# Altium schematic symbol library Altium_Lib.SchLib: 403 symbols (part 2 of 4) (continued)
## DIODE_TV02W6V0B-G (continued)

## DIODE_US1M-13-F
designator D?, comment US1M-13-F
DIODE GEN PURP 1KV 1A SMA; Manufacturer: Diodes Incorporated; Diode Type: Standard; Speed: Fast Recovery =< 500ns, > 200mA (Io); Capacitance @ Vr, F: 10pF @ 4V, 1MHz; Current - Reverse Leakage @ Vr: 5µA @ 1000V; Part Status: Active; Current - Average Rectified (Io): 1A; Packaging: Tape & Reel (TR); RoHS: RoHS Compliant; Base Part Number: US1M; Operating Temperature - Junction: -65°C ~ 150°C; Supplier Device Package: SMA; Package / Case: DO-214AC, SMA; Mounting Type: Surface Mount; Supplier: Digi-Key; Category: Discrete Semiconductor Products; Manufacturer Part Number: US1M-13-F; ComponentLink1URL: https://www.diodes.com/assets/Datasheets/ds16008.pdf; ComponentLink1Description: https://www.diodes.com/assets/Datasheets/ds16008.pdf; Pricing: 5000=0.0935, 10000=0.08525, 25000=0.07975, 50000=0.0715 (USD); Supplier Part Number: US1M-FDITR-ND
footprint DO-214AC-SMA
pins: 1 A, 2 K

## DRV5053VAQDBZR
designator U?
SENSOR LINEAR ANALOG SOT23-3; Manufacturer: Texas Instruments; Axis: Single; Current - Output (Max): 2.3mA; Sensing Range: ±9mT; Current - Supply (Max): 3.6mA; Bandwidth: 20kHz; Voltage - Supply: 2.5 V ~ 38 V; Output Type: Analog Voltage; RoHS: RoHS Compliant; Features: Temperature Compensated; Supplier Device Package: SOT-23-3; Resolution: -; Packaging: Tape & Reel (TR); Part Status: Active; Operating Temperature: -40°C ~ 125°C (TA); Package / Case: TO-236-3, SC-59, SOT-23-3; Technology: Hall Effect; Manufacturer Part Number: DRV5053VAQDBZR; Category: Sensors, Transducers; Supplier: Digi-Key; ComponentLink1URL: http://www.ti.com/lit/ds/symlink/drv5053.pdf; ComponentLink1Description: http://www.ti.com/lit/ds/symlink/drv5053.pdf; Pricing: 3000=0.4368, 6000=0.4095, 9000=0.38903, 15000=0.37538 (USD); Supplier Part Number: 296-38460-2-ND
footprint SOT23_L (SOT23, 3-Leads, Body 2.9x1.3mm, Pitch 0.95mm, Lead Span 2.3mm, IPC High Density)
pins: 1 VCC, 2 OUT, 3 GND

## DRV8825_DEV_BOARD
designator U?
DRV8825 STEPPER MTR DRVR CARRIER; Manufacturer: Pololu Corporation; Manufacturer Part Number: 2977
footprint DRV8825_DEV_BOARD
pins: 1 ENABLE, 2 M0, 3 M1, 4 M2, 5 RESET, 6 SLEEP, 7 STEP, 8 DIR, 9 GND, 10 FAULT, 11 A2, 12 A1, 13 B1, 14 B2, 15 GND, 16 VMOT

## DRV8825PWPR
designator U?
IC MTR DRVR BIPLR 8.2-45V 28SSOP; Manufacturer: Texas Instruments; Number of Outputs: 2 Output; Output Current: 1.8 A; Development Kit: DRV8825EVM; Operating Supply Current: 5 mA; Operating Supply Voltage: 8.2 V to 45 V; Rds On - Drain-Source Resistance: 400 mOhms; Supplier 1: Mouser; Manufacturer Part Number: DRV8825PWPR; RoHS: RoHS Compliant; Category: Motor / Motion / Ignition Controllers & Drivers; Stock 1: 8639; Pricing 1: 1=4.25, 10=3.81, 25=3.60, 100=2.96, 250=2.66, 500=2.56, 1000=2.13, 2000=2.05, 4000=1.99 (USD); Features: Integrated micro-stepping; Operating Temperature Range: - 40 C to + 85 C; Package / Case: HTSSOP-28; Packaging: Cut Tape; Product: Stepper Motor Controllers / Drivers; Series: DRV8825; Type: Stepping Motor Controller; Brand: Texas Instruments; Mounting Style: SMD/SMT; Maximum Operating Temperature: + 85 C; Minimum Operating Temperature: - 40 C; Moisture Sensitive: Yes; Product Type: Motor / Motion / Ignition Controllers & Drivers; Standard Pack Qty: 2000; Subcategory: PMIC - Power Management ICs; RoHS - Mouser: Y; Minimum Order Quantity: 1; Reeling: True; Supplier Part Number 1: 595-DRV8825PWPR
footprint TSSOP-28-PowerPad
pins: 0 GND, 1 CP1, 2 CP2, 3 VCP, 4 VMA, 5 AOUT1, 6 ISENA, 7 AOUT2, 8 BOUT2, 9 ISENB, 10 BOUT1, 11 VMB, 12 AVREF, 13 BVREF, 14 GND, 15 V3P3OUT, 16 nRESET, 17 nSLEEP, 18 nFAULT, 19 DECAY, 20 DIR, 21 nENBL, 22 STEP, 23 NC, 24 MODE0, 25 MODE1, 26 MODE2, 27 nHOME, 28 GND

## DRV8844PWPR
designator U?
IC MTR DRV BIPOLR 8-60V 28HTSSOP; Manufacturer: Texas Instruments; Number of Outputs: 4 Output; Output Current: 3.5 A; Development Kit: DRV8844EVM; Operating Supply Current: 1 mA; Operating Supply Voltage: 8 V to 60 V; Rds On - Drain-Source Resistance: 480 mOhms; Supplier 1: Mouser; RoHS: RoHS Compliant; Category: Motor / Motion / Ignition Controllers & Drivers; Stock 1: 8824; Pricing 1: 1=3.32, 10=2.98, 25=2.82, 100=2.32, 250=2.08, 500=2.00, 1000=1.67, 2000=1.60, 4000=1.55 (USD); Features: Independent 1/2-H PWM Control, Split-Rail Support; Operating Temperature Range: - 40 C to + 85 C; Package / Case: HTSSOP-28; Packaging: Cut Tape; Series: DRV8844; Type: Half Bridge; Brand: Texas Instruments; Mounting Style: SMD/SMT; Maximum Operating Temperature: + 85 C; Minimum Operating Temperature: - 40 C; Moisture Sensitive: Yes; Product Type: Motor / Motion / Ignition Controllers & Drivers; Standard Pack Qty: 2000; Subcategory: PMIC - Power Management ICs; RoHS - Mouser: Y; Minimum Order Quantity: 1; Reeling: True; Supplier Part Number 1: 595-DRV8844PWPR; Manufacturer Part Number: DRV8844PWPR
footprint HTSSOP28
pins: 0 GND, 1 CP1 (power), 2 CP2 (power), 3 VCP (power), 4 VM (power), 5 OUT1 (out), 6 SRC12, 7 OUT2 (out), 8 OUT3 (out), 9 SRC34, 10 OUT4 (out), 11 VM (power), 12 NC (in), 13 NC (in), 14 GND (power), 15 V3P3OUT (out), 16 nRESET (in), 17 nSLEEP (in), 18 nFAULT (out), 19 LGND, 20 EN4 (in), 21 IN4 (in), 22 EN3 (in), 23 IN3 (in), 24 EN2 (in), 25 IN2 (in), 26 EN1 (in), 27 IN1 (in), 28 GND (power)

## DRV8872DDAR
designator U?
IC MOTOR DRVR UNIPLR 8SO PWRPAD; Manufacturer: Texas Instruments; Number of Outputs: 2 Output; Operating Frequency: 100 kHz; Output Current: 3.6 A; Operating Supply Current: 3 mA; Operating Supply Voltage: 6.5 V to 45 V; Supplier 1: Mouser; Manufacturer Part Number: DRV8872DDAR; RoHS: RoHS Compliant; Category: Motor / Motion / Ignition Controllers & Drivers; Stock 1: 16722; Pricing 1: 1=2.50, 10=2.12, 100=1.70, 500=1.48, 1000=1.23, 2500=1.14, 5000=1.10, 10000=1.06 (USD); Features: Current Regulation; Operating Temperature Range: - 40 C to + 125 C; Package / Case: SO-PowerPad-8; Packaging: Cut Tape; Product: Brushed DC Motor Drivers; Series: DRV8872; Type: Half Bridge; Brand: Texas Instruments; Mounting Style: SMD/SMT; Maximum Operating Temperature: + 125 C; Minimum Operating Temperature: - 40 C; Moisture Sensitive: Yes; Product Type: Motor / Motion / Ignition Controllers & Drivers; Standard Pack Qty: 2500; Subcategory: PMIC - Power Management ICs; RoHS - Mouser: Y; Minimum Order Quantity: 1; Reeling: True; Supplier Part Number 1: 595-DRV8872DDAR
footprint SOIC-8_L TPAD (SOIC, 8-Leads, Body 4.9x3.9mm, Pitch 1.27mm, IPC High Density)
pins: 0 TPAD, 1 GND, 2 IN2, 3 IN1, 4 nFAULT, 5 VM, 6 OUT1, 7 ISEN, 8 OUT2

## EARU_SSR-25DD
designator U?
Solid state relay DC input, DC output 25A; Manufacturer: EARU; Manufacturer Part Number: EARU_SSR-25DD
footprint SSR-25-DD_EARU
pins: 1 IN+, 2 IN-, 3 OUT, 4 OUT

## EFR32FG12P232F1024GM48-CR
designator U?
FLEX GECKO; Manufacturer: Silicon Labs; Frequency: 2.4GHz; Power - Output: 20dBm; Sensitivity: -95dBm; Memory Size: 1MB Flash, 128kB RAM; Serial Interfaces: I²C, I²S, SPI, UART; Manufacturer Part Number: EFR32FG12P232F1024GM48-CR; Category: RF/IF and RFID; Supplier: Digi-Key; RoHS: RoHS Compliant; Part Status: Active; Type: TxRx + MCU; RF Family/Standard: -; Protocol: -; Modulation: -; Data Rate (Max): -; Voltage - Supply: -; Current - Receiving: -; Current - Transmitting: -; Operating Temperature: -; ComponentLink1URL: https://www.silabs.com/documents/public/data-sheets/efr32fg12-datasheet.pdf; ComponentLink1Description: https://www.silabs.com/documents/public/data-sheets/efr32fg12-datasheet.pdf; Pricing: 2500=6.56528 (USD); Stock: 0; Supplier Part Number: EFR32FG12P232F1024GM48-CR-ND
footprint QFN48-(7mmX7mm) (QFN, 48-Leads, Body 7,1x7,1mm (max), Pitch 0,50mm, IPC Medium Density)
pins: 0 VSS_PAD, 1 PF0, 2 PF1, 3 PF2, 4 PF3, 5 PF4, 6 PF5, 7 PF6, 8 PF7, 9 RFVDD, 10 HFXTAL_N, 11 HFXTAL_P, 12 RESETn, 13 NC, 14 RFVSS, 15 PAVSS, 16 2G4RF_ION, 17 2G4RF_IOP, 18 PAVDD, 19 PD10, 20 PD11, 21 PD12, 22 PD13, 23 PD14, 24 PD15, 25 PA0, 26 PA1, 27 PA2, 28 PA3, 29 PA4, 30 PA5, 31 PB11, 32 PB12, 33 PB13, 34 AVDD, 35 PB14/LFXTAL_P, 36 PB15/LFXTAl_N, 37 VREGVSS, 38 VREGSW, 39 VREGVDD, 40 DVDD, 41 DECOUPLE, 42 IOVDD, 43 PC6, 44 PC7, 45 PC8, 46 PC9, 47 PC10, 48 PC11

## ESP32-WROVER-E (4MB)
designator U?, comment ESP32-WROVER-E
RX TXRX MOD WIFI PCB TRACE SMD; Manufacturer: ESPRESSIF; Unit: pcs; SuppliedAmount: 0; MinAmount: 1; Type of communications module: IoT; Interface: GPIO; Receiver sensitivity: -98dBm; Transmitter output power: 19.5dBm; Supply voltage: 3...3.6V DC; Components: ESP32-D0WD-V3; Flash memory capacity: 4MB; SRAM memory capacity: 8MB; Number of cores: 2; Kind of network: Bluetooth Low Energy; Band: 2.412...2.484GHz; Supplier 1: TME; Manufacturer Part Number: ESP32-WROVER-E; Category: IoT (WiFi/Bluetooth) modules; Stock 1: 1; Pricing 1: 1=3,65, 5=3,5, 25=3,4, 100=3,15 (USD); Weight: 2,696; Multiples: 1; Price Type: NET; Dimensions: 18x31.4x3.3mm; Mounting: SMD; Kind of antenna: PCB; ComponentLink1URL: http://www.tme.eu/en/details/esp32-wrover-e/iot-wifi-bluetooth-modules/espressif/; ComponentLink1Description: http://www.tme.eu/en/details/esp32-wrover-e/iot-wifi-bluetooth-modules/espressif/; Supplier Part Number 1: ESP32-WROVER-E
footprint ESP32-WROVER-E
pins: 0 GNDP (power), 1 GND1 (power), 2 3V3 (power), 3 EN (power), 4 SENSOR_VP (power), 5 SENSOR_VN (power), 6 IO34 (io), 7 IO35 (io), 8 IO32 (io), 9 IO33 (io), 10 IO25 (io), 11 IO26 (io), 12 IO27 (io), 13 IO14 (io), 14 IO12 (io), 15 GND2 (power), 16 IO13 (io), 17 NC, 18 NC, 19 NC, 20 NC, 21 NC, 22 NC, 23 IO15 (io), 24 IO2 (io), 25 IO0 (io), 26 IO4 (io), 27 NC, 28 NC, 29 IO5 (io), 30 IO18 (io), 31 IO19 (io), 32 NC, 33 IO21 (io), 34 RXD0 (io), 35 TXD0 (io), 36 IO22 (io), 37 IO23 (io), 38 GND3 (power)

## Feritte_Bead__MPZ1608S102ATA00
designator FB?, comment MPZ1608S102ATA00
FERRITE BEAD 1 KOHM 0603 1LN; Manufacturer: TDK Corporation; Current Rating (Max): 800mA; DC Resistance (DCR) (Max): 300 mOhm; Filter Type: Power Line; Impedance @ Frequency: 1 kOhm @ 100MHz; Number of Lines: 1; Category: Filters; Height (Max): 0.037" (0.95mm); Manufacturer Part Number: MPZ1608S102ATA00; Mounting Type: Surface Mount; Operating Temperature: -55°C ~ 125°C; Package / Case: 0603 (1608 Metric); Packaging: Tape & Reel (TR); Part Status: Active; Ratings: -; RoHS: RoHS Compliant; Size / Dimension: 0.063" L x 0.031" W (1.60mm x 0.80mm); Supplier: Digi-Key; ComponentLink1URL: https://product.tdk.com/info/en/catalog/datasheets/beads_commercial_power_mpz1608_en.pdf; ComponentLink1Description: https://product.tdk.com/info/en/catalog/datasheets/beads_commercial_power_mpz1608_en.pdf; Pricing: 4000=0.0208, 8000=0.01885, 12000=0.0182, 28000=0.0169, 100000=0.01671 (USD); Supplier Part Number: 445-8694-2-ND
footprint L-0603 (Chip Inductor; Body 1.6 x 0.8 mm (LxW typ))
pins: 1, 2

## Ferrite_Bead__74279266
designator FB?, comment 742792664
FERRITE BEAD 1 KOHM 0603 1LN; Manufacturer: Wurth Electronics Inc.; Current Rating (Max): 300mA; Filter Type: Signal Line; DC Resistance (DCR) (Max): 600 mOhm; Category: Filters; Height (Max): 0.039" (1.00mm); Package / Case: 0603 (1608 Metric); Part Status: Active; Mounting Type: Surface Mount; Operating Temperature: -55°C ~ 125°C; RoHS: RoHS Compliant; Manufacturer Part Number: 742792664; Supplier: Digi-Key; Size / Dimension: 0.063" L x 0.031" W (1.60mm x 0.80mm); Packaging: Cut Tape (CT); Ratings: -; ComponentLink1URL: http://katalog.we-online.de/pbs/datasheet/742792664.pdf; ComponentLink1Description: http://katalog.we-online.de/pbs/datasheet/742792664.pdf; Pricing: 1=0.14, 50=0.14, 100=0.129, 500=0.123, 1000=0.118, 2000=0.112 (USD); Stock: 79820; Supplier Part Number: 732-1586-1-ND
footprint L-0603 (Chip Inductor; Body 1.6 x 0.8 mm (LxW typ))
pins: 1, 2

## Ferrite_Bead__742792042
designator FB?, comment 742792042
FERRITE BEAD 600 OHM 0805 1LN; Manufacturer: Wurth Electronics Inc.; Current Rating (Max): 200mA; Filter Type: Signal Line; DC Resistance (DCR) (Max): 500 mOhm; Impedance @ Frequency: 600 Ohm @ 100MHz; Height (Max): 0.043" (1.10mm); Size / Dimension: 0.079" L x 0.047" W (2.00mm x 1.20mm); Category: Filters; Supplier: Digi-Key; Part Status: Active; Packaging: Tape & Reel (TR); Manufacturer Part Number: 742792042; RoHS: RoHS Compliant; Ratings: -; Package / Case: 0805 (2012 Metric); Mounting Type: Surface Mount; Operating Temperature: -55°C ~ 125°C; ComponentLink1URL: http://katalog.we-online.de/pbs/datasheet/742792042.pdf; ComponentLink1Description: http://katalog.we-online.de/pbs/datasheet/742792042.pdf; Supplier Part Number: 732-4642-2-ND
footprint L-0805 (Chip Inductor; Body 2.0 x 1.3 mm (LxW typ))
pins: 1, 2

## Ferrite_Bead__BLM18AG601SN1D
designator FB?, comment BLM18AG601SN1D
FERRITE BEAD 600 OHM 0603 1LN; Manufacturer: Murata Electronics North America; Current Rating (Max): 500mA; DC Resistance (DCR) (Max): 380 mOhm; RoHS: RoHS Compliant; Package / Case: 0603 (1608 Metric); Size / Dimension: 0.063" L x 0.031" W (1.60mm x 0.80mm); Operating Temperature: -55°C ~ 125°C; Filter Type: -; Part Status: Active; Manufacturer Part Number: BLM18AG601SN1D; Supplier: Digi-Key; Category: Filters; Height (Max): 0.037" (0.95mm); Packaging: Cut Tape (CT); Mounting Type: Surface Mount; Ratings: -; ComponentLink1URL: https://www.murata.com/en-us/products/productdata/8796738650142/ENFA0003.pdf; ComponentLink1Description: https://www.murata.com/en-us/products/productdata/8796738650142/ENFA0003.pdf; Pricing: 1=0.1, 10=0.079, 25=0.072, 50=0.0648, 100=0.0476, 250=0.0346, 500=0.0317, 1000=0.02738 (USD); Supplier Part Number: 490-1014-1-ND
footprint L-0603 (Chip Inductor; Body 1.6 x 0.8 mm (LxW typ))
pins: 1, 2

## Ferrite_Bead__BLM18HE152SN1D
designator FB?, comment BLM18HE152SN1D
FERRITE BEAD 1.5 KOHM 0603 1LN; Manufacturer: Murata Electronics North America; Current Rating (Max): 500mA; Filter Type: Signal Line; DC Resistance (DCR) (Max): 500 mOhm; Category: Filters; Manufacturer Part Number: BLM18HE152SN1D; Package / Case: 0603 (1608 Metric); Packaging: Cut Tape (CT); Part Status: Active; Mounting Type: Surface Mount; Size / Dimension: 0.063" L x 0.031" W (1.60mm x 0.80mm); RoHS: RoHS Compliant; Ratings: -; Operating Temperature: -55°C ~ 125°C; Height (Max): 0.037" (0.95mm); Supplier: Digi-Key; ComponentLink1URL: https://www.murata.com/en-us/products/productdata/8796741599262/ENFA0004.pdf; ComponentLink1Description: https://www.murata.com/en-us/products/productdata/8796741599262/ENFA0004.pdf; Pricing: 1=0.21, 10=0.16, 25=0.1324, 50=0.1142, 100=0.1027, 250=0.08672, 500=0.0776, 1000=0.06619 (USD); Supplier Part Number: 490-5216-1-ND
footprint L-0603 (Chip Inductor; Body 1.6 x 0.8 mm (LxW typ))
pins: 1, 2

## Ferrite_Bead__BLM21PG220SN1D
designator FB?, comment BLM21PG220SN1D
FERRITE BEAD 22 OHM 0805 1LN; Manufacturer: Murata; Manufacturer Series: BLM21P; Material: Steel,Ferrite; Impedance: 22R; DC Resistance (DCR): 9mR; Tolerance: 25%; Current Rating: 6A; Shielding: Unshielded; Number of Circuits: 1; Resistance: 10mR; Test Frequency: 100MHz; Supplier 1: Avnet; Manufacturer Part Number: BLM21PG220SN1D; Stock 1: 0; Pricing 1: 4000=0.0273, 8000=0.0267, 16000=0.0263, 24000=0.0256, 32000=0.025 (USD); Case/Package: 0805; Number of Pins: 2; Core Material: Ferrite; Case Code (Metric): 2012; Case Code (Imperial): 0805; Weight: 0.000194oz; Terminal Finish: Tin; Min Operating Temperature: -55°C; Max Operating Temperature: 125°C; Packaging: Tape and Reel; Max DC Current: 6A; Number of Lines: 1; Series: BLM21P; Package Quantity: 1; Max Current Rating: 6A; Termination: SMD/SMT; DC Current: 6A; DC Resistance-Max: 9mR; Number of Functions: 1; Length: 2mm; Width: 1.25mm; Height: 0.85mm; Depth: 1.25mm; Radiation Hardening: No; REACH SVHC: No SVHC; Lead Free: Lead Free; RoHS Compliant: Yes; ComponentLink1URL: http://www.murata.com/products/catalog/pdf/c31e.pdf?src-supplier=Element14; ComponentLink1Description: http://www.murata.com/products/catalog/pdf/c31e.pdf?src-supplier=Element14; ComponentLink2URL: http://www.murata.com/products/catalog/pdf/c31e.pdf?src-supplier=Distrelec; ComponentLink2Description: http://www.murata.com/products/catalog/pdf/c31e.pdf?src-supplier=Distrelec; ComponentLink3URL: http://www.jameco.com/Jameco/Products/ProdDS/1845312.pdf?src-supplier=Jameco; ComponentLink3Description: http://www.jameco.com/Jameco/Products/ProdDS/1845312.pdf?src-supplier=Jameco; ComponentLink4URL: https://www.murata.com/en-us/products/productdata/8796738977822/ENFA0005.pdf?src-supplier=Digi-Key; ComponentLink4Description: https://www.murata.com/en-us/products/productdata/8796738977822/ENFA0005.pdf?src-supplier=Digi-Key; ComponentLink5URL: http://uk.rs-online.com/webdocs/13ec/0900766b813ecf58.pdf?src-supplier=RSComponents; ComponentLink5Description: http://uk.rs-online.com/webdocs/13ec/0900766b813ecf58.pdf?src-supplier=RSComponents; ComponentLink6URL: http://www.murata.com/products/catalog/pdf/c31e.pdf?src-supplier=Avnet; ComponentLink6Description: http://www.murata.com/products/catalog/pdf/c31e.pdf?src-supplier=Avnet; ComponentLink7URL: http://search.murata.co.jp/Ceramy/image/img/PDF/ENG/L0110S0100BLM21P.pdf?src-supplier=Future+Electronics; ComponentLink7Description: http://search.murata.co.jp/Ceramy/image/img/PDF/ENG/L0110S0100BLM21P.pdf?src-supplier=Future+Electronics; ComponentLink8URL: http://www.produktinfo.conrad.com/datenblaetter/1100000-1199999/001171738-da-01-en-CHIP_DROSSEL0805_22R0_6000MA_2_0X1_25MM.pdf?src-supplier=Conrad; ComponentLink8Description: http://www.produktinfo.conrad.com/datenblaetter/1100000-1199999/001171738-da-01-en-CHIP_DROSSEL0805_22R0_6000MA_2_0X1_25MM.pdf?src-supplier=Conrad; Supplier Part Number 1: BLM21PG220SN1D
footprint L-0805 (Chip Inductor; Body 2.0 x 1.3 mm (LxW typ))
pins: 1, 2

## Fiducial
designator F?, comment Pick_and_place  (value not drawn)  (no BOM)
Pick & Place Reference point; Manufacturer Part Number: Pick_and_place
footprint FIDUCIAL_C

## Header 5x1
designator J?
Manufacturer Part Number: Header 5x1
footprint Pin Header 5x1 Female 1.27 - Bottom_Masked
pins: 1 (io), 2 (io), 3 (io), 4 (io), 5 (io)

## HEADER_2X20_POS(LCD)__PPPC201LGBN-RC
designator J?, comment PPPC201LGBN-RC
CONN FEMALE 20POS .100" R/A GOLD; Manufacturer: Sullins Connector Solutions; Material Flammability Rating: UL94 V-0; Style: Board to Board; Contact Length - Post: 0.124" (3.15mm); Pitch - Mating: 0.100" (2.54mm); Number of Positions: 20; Number of Positions Loaded: All; Connector Type: Header; Current Rating: 3A; Voltage Rating: 250V; Contact Finish Thickness - Mating: Flash; Contact Finish - Post: Gold; Insulation Color: Black; Insulation Height: 0.100" (2.54mm); Contact Finish - Mating: Gold; Operating Temperature: -40°C ~ 105°C; Category: Connectors, Interconnects; Supplier: Digi-Key; Fastening Type: Push-Pull; Manufacturer Part Number: PPPC201LGBN-RC; Contact Type: Female Socket; Number of Rows: 1; Packaging: Bulk; Termination: Solder; Row Spacing - Mating: -; Mounting Type: Through Hole, Right Angle; RoHS: RoHS Compliant; Part Status: Active; Contact Material: Phosphor Bronze; Contact Finish Thickness - Post: Flash; Contact Shape: Square; Insulation Material: Polyester; Applications: -; Features: -; Ingress Protection: -; Mated Stacking Heights: -; ComponentLink1URL: http://www.sullinscorp.com/drawings/78_P(N)PxCxx1LGBN-RC,_10493-G.pdf; ComponentLink1Description: http://www.sullinscorp.com/drawings/78_P(N)PxCxx1LGBN-RC,_10493-G.pdf; Pricing: 1=1.55, 10=1.279, 25=1.1992, 50=1.066, 100=0.9594, 250=0.8848, 500=0.7995, 1000=0.70889, 2500=0.67958 (USD); Supplier Part Number: S5495-ND
footprint HEADER_20P_1R_R
pins: 1 (io), 2 (io), 3 (io), 4 (io), 5 (io), 6 (io), 7 (io), 8 (io), 9 (io), 10 (io), 11 (io), 12 (io), 13 (io), 14 (io), 15 (io), 16 (io), 17 (io), 18 (io), 19 (io), 20 (io)

## HEADER_4(2X2)
designator U?, comment 0702871098  (no BOM)
CONN HEADER BKWY DL GOLD 4POS PAD; Manufacturer: Molex; Number of Positions: 4; Pitch: 2.54mm; Manufacturer Part Number: 0702871098; Number of Rows: 2; Orientation: Straight; Number of Contacts: 4
footprint HEADER_4_(2X2)__2.54mm_180 - No_Mechanical
pins: 1 (io), 2 (io), 3 (io), 4 (io)

## HEADER_4(2X2)__0702871098
designator U?, comment 0702871098
CONN HEADER BKWY DL GOLD 4POS; Manufacturer: Molex; Number of Positions: 4; Connector Type: Male Pin; Max Voltage Rating (DC): 250V; Pitch: 2.54mm; Row Spacing: 0.1inch; Supplier 1: Avnet; Manufacturer Part Number: 0702871098; Stock 1: 0; Pricing 1: 10000=0.2059, 20000=0.2029, 30000=0.1818, 50000=0.1791, 100000=0.1737, 500000=0.171, 1000000=0.169 (USD); Mount: Through Hole; Contact Plating: Gold; Contact Material: Brass; Housing Material: Thermoplastic; Color: Black; Housing Color: Black; Min Operating Temperature: -40°C; Max Operating Temperature: 120°C; Packaging: Bulk; Number of Rows: 2; Termination: Solder; Orientation: Straight; Number of Contacts: 4; Series: C-Grid® 70287; Contact Type: Male Pin; Length: 5.08mm; Depth: 5.08mm; Contact Mating Length: 0.24inch; Radiation Hardening: No; RoHS Compliant: Yes; ComponentLink1URL: http://www.molex.com/pdm_docs/sd/702871000_sd.pdf?src-supplier=Digi-Key; ComponentLink1Description: http://www.molex.com/pdm_docs/sd/702871000_sd.pdf?src-supplier=Digi-Key; ComponentLink2URL: http://www.molex.com/webdocs/datasheets/pdf/en-us/0702871098_PCB_HEADERS.pdf?src-supplier=Avnet; ComponentLink2Description: http://www.molex.com/webdocs/datasheets/pdf/en-us/0702871098_PCB_HEADERS.pdf?src-supplier=Avnet; Supplier Part Number 1: 0702871098
footprint HEADER_4_(2X2)__2.54mm_180
pins: 1 (io), 2 (io), 3 (io), 4 (io)

## HEADER_4__61300411121
designator J?, comment 61300411121
CONN HEADER 4 POS 2.54; Manufacturer: Wurth Electronics Inc.; Style: Board to Board or Cable; Overall Contact Length: 0.454" (11.54mm); Number of Positions: 4; Pitch - Mating: 0.100" (2.54mm); Shrouding: Unshrouded; Material Flammability Rating: UL94 V-0; Contact Length - Post: 0.118" (3.00mm); Voltage Rating: 250V; Contact Length - Mating: 0.236" (6.00mm); Number of Positions Loaded: All; Current Rating: 3A; Category: Connectors, Interconnects; Contact Finish - Mating: Gold; Number of Rows: 1; Insulation Height: 0.100" (2.54mm); RoHS: RoHS Compliant; Contact Type: Male Pin; Packaging: Bulk; Manufacturer Part Number: 61300411121; Contact Finish Thickness - Post: -; Insulation Material: Polybutylene Terephthalate (PBT); Contact Material: Copper Alloy; Termination: Solder; Supplier: Digi-Key; Contact Finish Thickness - Mating: -; Mated Stacking Heights: -; Ingress Protection: -; Contact Shape: Square; Row Spacing - Mating: -; Contact Finish - Post: -; Applications: -; Operating Temperature: -40°C ~ 125°C; Features: -; Connector Type: Header; Part Status: Active; Fastening Type: Push-Pull; Mounting Type: Through Hole; Insulation Color: Black; ComponentLink1URL: http://katalog.we-online.de/em/datasheet/6130xx11121.pdf; ComponentLink1Description: http://katalog.we-online.de/em/datasheet/6130xx11121.pdf; Pricing: 1=0.18, 10=0.153, 25=0.1272, 50=0.106, 100=0.096, 1000=0.088 (USD); Supplier Part Number: 732-5317-ND
footprint HEADER_4__61300411121
pins: 1 (io), 2 (io), 3 (io), 4 (io)

## HEADER_5__61300511021
designator J?, comment 61300511021
CONN HEADER 5 POS RA 2.54; Manufacturer: Wurth Electronics Inc.; Current Rating: 3A; Number of Positions Loaded: All; Pitch - Mating: 0.100" (2.54mm); Shrouding: Unshrouded; Contact Length - Mating: 0.236" (6.00mm); Contact Length - Post: 0.118" (3.00mm); Material Flammability Rating: UL94 V-0; Voltage Rating: 250V; Number of Positions: 5; Style: Board to Board or Cable; Packaging: Bulk; Row Spacing - Mating: -; Contact Type: Male Pin; Contact Material: Copper Alloy; Part Status: Active; Termination: Solder; Overall Contact Length: -; Features: -; Insulation Material: Polybutylene Terephthalate (PBT); Manufacturer Part Number: 61300511021; Mated Stacking Heights: -; RoHS: RoHS Compliant; Ingress Protection: -; Fastening Type: Push-Pull; Contact Shape: Square; Category: Connectors, Interconnects; Connector Type: Header; Operating Temperature: -40°C ~ 125°C; Contact Finish - Post: -; Contact Finish Thickness - Post: -; Number of Rows: 1; Contact Finish - Mating: Gold; Insulation Color: Black; Supplier: Digi-Key; Contact Finish Thickness - Mating: -; Applications: -; Mounting Type: Through Hole, Right Angle; Insulation Height: 0.100" (2.54mm); ComponentLink1URL: http://katalog.we-online.de/em/datasheet/6130xx11021.pdf; ComponentLink1Description: http://katalog.we-online.de/em/datasheet/6130xx11021.pdf; Supplier Part Number: 732-5338-ND
footprint HEADER_5__61300511021
pins: 1 (io), 2 (io), 3 (io), 4 (io), 5 (io)

## HEADER_6__61300611121
designator J?, comment 61300611121
CONN HEADER 6 POS 2.54; Manufacturer: Wurth Electronics Inc.; Material Flammability Rating: UL94 V-0; Current Rating: 3A; Voltage Rating: 250V; Shrouding: Unshrouded; Contact Length - Mating: 0.236" (6.00mm); Contact Length - Post: 0.118" (3.00mm); Overall Contact Length: 0.454" (11.54mm); Number of Positions Loaded: All; Style: Board to Board or Cable; Pitch - Mating: 0.100" (2.54mm); Number of Positions: 6; Contact Material: Copper Alloy; Insulation Material: Polybutylene Terephthalate (PBT); Features: -; Operating Temperature: -40°C ~ 125°C; Ingress Protection: -; Insulation Color: Black; Mated Stacking Heights: -; Contact Finish Thickness - Post: -; Applications: -; Termination: Solder; Mounting Type: Through Hole; Supplier: Digi-Key; Category: Connectors, Interconnects; Contact Shape: Square; Contact Finish - Mating: Gold; Contact Finish Thickness - Mating: -; Contact Finish - Post: -; RoHS: RoHS Compliant; Packaging: Bulk; Fastening Type: Push-Pull; Row Spacing - Mating: -; Manufacturer Part Number: 61300611121; Insulation Height: 0.100" (2.54mm); Connector Type: Header; Part Status: Active; Number of Rows: 1; Contact Type: Male Pin; ComponentLink1URL: http://katalog.we-online.de/em/datasheet/6130xx11121.pdf; ComponentLink1Description: http://katalog.we-online.de/em/datasheet/6130xx11121.pdf; Pricing: 1=0.33, 10=0.279, 25=0.232, 50=0.194, 100=0.176, 1000=0.16 (USD); Supplier Part Number: 732-5319-ND
footprint HEADER_6__61300611121
pins: 1 (io), 2 (io), 3 (io), 4 (io), 5 (io), 6 (io)

## HEADER_7__61300711121
designator J?, comment 61300711121
CONN HEADER 7 POS 2.54; Manufacturer: Wurth Electronics Inc.; Current Rating: 3A; Voltage Rating: 250V; Material Flammability Rating: UL94 V-0; Style: Board to Board or Cable; Number of Positions Loaded: All; Overall Contact Length: 0.454" (11.54mm); Number of Positions: 7; Contact Length - Mating: 0.236" (6.00mm); Contact Length - Post: 0.118" (3.00mm); Shrouding: Unshrouded; Pitch - Mating: 0.100" (2.54mm); Contact Shape: Square; Insulation Height: 0.100" (2.54mm); Insulation Color: Black; Contact Finish Thickness - Mating: -; Operating Temperature: -40°C ~ 125°C; Contact Material: Copper Alloy; Features: -; Ingress Protection: -; Contact Finish - Post: -; Mated Stacking Heights: -; Contact Finish - Mating: Gold; Applications: -; Contact Finish Thickness - Post: -; Insulation Material: Polybutylene Terephthalate (PBT); Manufacturer Part Number: 61300711121; Fastening Type: Push-Pull; Supplier: Digi-Key; Category: Connectors, Interconnects; Mounting Type: Through Hole; Row Spacing - Mating: -; Connector Type: Header; Number of Rows: 1; Termination: Solder; RoHS: RoHS Compliant; Packaging: Bulk; Contact Type: Male Pin; Part Status: Active; ComponentLink1URL: http://katalog.we-online.de/em/datasheet/6130xx11121.pdf; ComponentLink1Description: http://katalog.we-online.de/em/datasheet/6130xx11121.pdf; Pricing: 1=0.37, 10=0.315, 25=0.2632, 50=0.219, 100=0.199, 1000=0.181 (USD); Supplier Part Number: 732-5320-ND
footprint HEADER_7__61300711121
pins: 1 (io), 2 (io), 3 (io), 4 (io), 5 (io), 6 (io), 7 (io)

## HEADER_12(2X6)__20021111-00012T4LF
designator U?, comment 20021111-00012T4LF
Headers & Wire Housings 12P HDR UNSHRD VERT 1.27x1.27MM BTB TH; Manufacturer: Amphenol ICC / FCI; Contact Resistance: 30mR; Current Rating: 12A; Voltage Rating: 125V; Number of Positions: 12; Insulation Resistance: 100MR; Gender: Male; Connector Type: Header; Pitch: 1.27mm; Row Spacing: 0.05inch; Contact Post Length: 2.3mm; Supplier 1: Avnet; Manufacturer Part Number: 20021111-00012T4LF; Stock 1: 0; Pricing 1: 3003=0.4281, 6006=0.4166, 12012=0.3965, 18018=0.3821, 24024=0.3706, 30030=0.3591, 300300=0.3505 (USD); Mount: Through Hole; Contact Plating: Gold; Contact Material: Nickel,Copper,Copper Alloy,Gold; Color: Black; Housing Color: Black; Housing Material: Thermoplastic; Min Operating Temperature: -40°C; Max Operating Temperature: 85°C; Number of Rows: 2; Packaging: Rail/Tube; Package Quantity: 77; Termination: Solder; Number of Contacts: 12; Max Voltage Rating (AC): 125V; Orientation: Straight; Series: Minitek; Contact Type: Male Pin; Length: 7.62mm; Contact Mating Length: 0.12inch; Depth: 3.4mm; REACH SVHC: No SVHC; Lead Free: Lead Free; RoHS Compliant: Yes; ComponentLink1URL: http://www.farnell.com/datasheets/1079612.pdf?src-supplier=Element14; ComponentLink1Description: http://www.farnell.com/datasheets/1079612.pdf?src-supplier=Element14; ComponentLink2URL: http://portal.fciconnect.com/Comergent/fci/drawing/20021111.pdf?src-supplier=Avnet; ComponentLink2Description: http://portal.fciconnect.com/Comergent/fci/drawing/20021111.pdf?src-supplier=Avnet; ComponentLink3URL: https://media.digikey.com/pdf/Data%20Sheets/FCI%20PDFs/Minitek%20127_Catalog.pdf?src-supplier=Digi-Key; ComponentLink3Description: https://media.digikey.com/pdf/Data%20Sheets/FCI%20PDFs/Minitek%20127_Catalog.pdf?src-supplier=Digi-Key; ComponentLink4URL: http://portal.fciconnect.com/Comergent//fci/drawing/20021111.pdf?src-supplier=Mouser; ComponentLink4Description: http://portal.fciconnect.com/Comergent//fci/drawing/20021111.pdf?src-supplier=Mouser; Supplier Part Number 1: 20021111-00012T4LF
footprint HEADER_12_(2X6)__1.27mm_180
pins: 1 (io), 2 (io), 3 (io), 4 (io), 5 (io), 6 (io), 7 (io), 8 (io), 9 (io), 10 (io), 11 (io), 12 (io)

## HEADER_14(2X7)__C0113-14DNTB00R
designator U?, comment C0113-14DNTB00R
CONN HEADER .100 7POS DL TIN PCB; Manufacturer: Hsuan Mao Technology Co. LTD; Manufacturer Part Number: C0113-14DNTB00R; ComponentLink1Description: http://www.hsm.net.tw/product_item.php?fcid=&cid=&id=501
footprint HEADER_14_(2X7)__2.54mm_MALE
pins: 1 (io), 2 (io), 3 (io), 4 (io), 5 (io), 6 (io), 7 (io), 8 (io), 9 (io), 10 (io), 11 (io), 12 (io), 13 (io), 14 (io)

## HEADER_16(2X8)__C0112-16DAAB00R
designator J?, comment C0112-16DAAB00R
CONN HEADER .100 8POS DL TIN PCB; Manufacturer: Hsuan Mao Technology Co. LTD; Pitch - Mating: .100 2.54mm; Manufacturer Part Number: C0112-16DAAB00R; ComponentLink1Description: http://www.hsm.net.tw/product_item.php?fcid=&cid=&id=500
footprint HEADER_16_(2X8)__2.54mm_FEMALE
pins: 1 (io), 2 (io), 3 (io), 4 (io), 5 (io), 6 (io), 7 (io), 8 (io), 9 (io), 10 (io), 11 (io), 12 (io), 13 (io), 14 (io), 15 (io), 16 (io)

## HEADER_16(2X8)__C0113-16DNTB00R
designator J?, comment C0113-16DNTB00R
CONN HEADER .100 8POS DL TIN PCB; Manufacturer: Hsuan Mao Technology Co. LTD; Pitch - Mating: .100 2.54mm; Manufacturer Part Number: C0113-16DNTB00R; ComponentLink1Description: http://www.hsm.net.tw/product_item.php?fcid=&cid=&id=501
footprint HEADER_16_(2X8)__2.54mm_MALE
pins: 1 (io), 2 (io), 3 (io), 4 (io), 5 (io), 6 (io), 7 (io), 8 (io), 9 (io), 10 (io), 11 (io), 12 (io), 13 (io), 14 (io), 15 (io), 16 (io)

## HEADER_20(2X10)__PPPC102LFBN-RC
designator J?, comment PPPC102LFBN-RC
CONN HEADER FEM 20POS.1" DL GOLD; Manufacturer: Sullins Connector Solutions; Style: Board to Board; Pitch - Mating: 0.100" (2.54mm); Number of Positions Loaded: All; Contact Length - Post: 0.126" (3.20mm); Current Rating: 3A; Number of Positions: 20; Voltage Rating: 250V; Material Flammability Rating: UL94 V-0; Contact Material: Phosphor Bronze; Contact Finish Thickness - Post: Flash; Fastening Type: Push-Pull; Contact Finish - Mating: Gold; Operating Temperature: -40°C ~ 105°C; Insulation Material: Polyester; RoHS: RoHS Compliant; Category: Connectors, Interconnects; Manufacturer Part Number: PPPC102LFBN-RC; Connector Type: Header; Contact Finish - Post: Gold; Packaging: Bulk; Contact Type: Female Socket; Part Status: Active; Row Spacing - Mating: 0.100" (2.54mm); Applications: -; Insulation Color: Black; Ingress Protection: -; Mounting Type: Through Hole; Termination: Solder; Insulation Height: 0.335" (8.51mm); Contact Shape: Square; Contact Finish Thickness - Mating: Flash; Mated Stacking Heights: -; Features: -; Supplier: Digi-Key; ComponentLink1URL: http://www.sullinscorp.com/drawings/78_P(N)PxCxxxLFBN-RC,_10492-H.pdf; ComponentLink1Description: http://www.sullinscorp.com/drawings/78_P(N)PxCxxxLFBN-RC,_10492-H.pdf; Pricing: 1=1.26, 10=1.144, 100=0.9809, 500=0.81742, 1000=0.70065, 5000=0.6747 (USD); Supplier Part Number: S6106-ND
footprint HEADER_20_(2X10)__2.54mm_180_FEMALE
pins: 1 (io), 2 (io), 3 (io), 4 (io), 5 (io), 6 (io), 7 (io), 8 (io), 9 (io), 10 (io), 11 (io), 12 (io), 13 (io), 14 (io), 15 (io), 16 (io), 17 (io), 18 (io), 19 (io), 20 (io)

## HEADER__10_(2X5)__0010897100
designator J?, comment 0010897100
BKWY HEADER 30 SAU 10POS; Manufacturer: Molex, LLC; Material Flammability Rating: UL94 V-0; Contact Length - Mating: 0.240" (6.10mm); Contact Length - Post: 0.107" (2.71mm); Overall Contact Length: 0.437" (11.10mm); Pitch - Mating: 0.100" (2.54mm); Connector Type: Header, Breakaway; Number of Positions Loaded: All; Number of Positions: 10; Shrouding: Unshrouded; Style: Board to Board or Cable; Manufacturer Part Number: 0010897100; Applications: Automotive, General Purpose, Lighting, Medical, Telecommunications; Contact Finish Thickness - Post: 74.8µin (1.90µm); Contact Finish - Mating: Gold; Contact Finish Thickness - Mating: 30.0µin (0.76µm); Insulation Color: Black; Features: -; Insulation Material: Liquid Crystal Polymer (LCP), Glass Filled; Contact Material: Copper Alloy; Contact Finish - Post: Tin; Mounting Type: Through Hole; Fastening Type: Push-Pull; Packaging: Bulk; Category: Connectors, Interconnects; Contact Shape: Square; Insulation Height: 0.090" (2.29mm); Part Status: Active; Ingress Protection: -; Operating Temperature: -; Supplier: Digi-Key; Mated Stacking Heights: -; Row Spacing - Mating: 0.100" (2.54mm); Number of Rows: 2; Contact Type: Male Pin; Voltage Rating: -; Current Rating: -; RoHS: RoHS Compliant; Termination: Solder; ComponentLink1URL: https://www.molex.com/pdm_docs/sd/010897100_sd.pdf; ComponentLink1Description: https://www.molex.com/pdm_docs/sd/010897100_sd.pdf; Pricing: 1=1.41, 10=1.24, 100=1.0694, 500=0.87498, 1000=0.77776, 5000=0.68054, 10000=0.64651 (USD); Supplier Part Number: WM13107-ND
footprint HEADER_10_(2X5)__2.54mm_180
pins: 1 (io), 2 (io), 3 (io), 4 (io), 5 (io), 6 (io), 7 (io), 8 (io), 9 (io), 10 (io)

## IDC_BOX_HEADER_7X2__0906631142
designator J?, comment 0906631142
QF50 SRD HDR VT .76AU 14POS; Manufacturer: Molex, LLC; Row Spacing - Mating: 0.100" (2.54mm); Shrouding: Shrouded - 4 Wall; Connector Type: Header; Contact Length - Post: 0.138" (3.50mm); Number of Positions Loaded: All; Material Flammability Rating: UL94 V-0; Overall Contact Length: 0.657" (16.70mm); Style: Board to Cable/Wire; Contact Length - Mating: 0.200" (5.08mm); Number of Positions: 14; Current Rating: -; Applications: -; Insulation Color: Black; Voltage Rating: -; Contact Finish Thickness - Post: 118.1µin (3.00µm); Mated Stacking Heights: -; Category: Connectors, Interconnects; Ingress Protection: -; Supplier: Digi-Key; Mounting Type: Through Hole; Contact Shape: Square; Part Status: Active; Termination: Solder; Contact Finish - Mating: Gold; Insulation Height: 0.642" (16.30mm); Contact Finish Thickness - Mating: 30µin (0.76µm); Contact Finish - Post: Tin; Fastening Type: Latch Lock/Eject Hooks; Packaging: Tray; Number of Rows: 2; Contact Type: Male Pin; Pitch - Mating: 0.100" (2.54mm); RoHS: RoHS Compliant; Operating Temperature: -; Manufacturer Part Number: 0906631142; Features: Mounting Flange; Contact Material: Brass; Insulation Material: Polyester, Glass Filled; ComponentLink1URL: http://www.molex.com/pdm_docs/sd/906631101_sd.pdf; ComponentLink1Description: http://www.molex.com/pdm_docs/sd/906631101_sd.pdf; Pricing: 1=2.48, 10=2.253, 50=2.0226, 100=1.9307, 250=1.74688, 500=1.60896, 1000=1.3791, 2500=1.28716, 5000=1.2228 (USD); Supplier Part Number: WM12815-ND
footprint HEADER_2X7__0906631142
pins: 1, 2, 3, 4, 5, 6, 7, 8, 9, 10, 11, 12, 13, 14

## IM02_Relay__ 9-1462038-8
designator K?, comment 9-1462038-8
RELAY TELECOM DPDT 5A 4.5V; Manufacturer: TE Connectivity Potter & Brumfield Relays; Coil Current: 31.1mA; Coil Power: 140 mW; Coil Resistance: 145 Ohms; Coil Type: Non Latching; Coil Voltage: 4.5VDC; Contact Form: DPDT (2 Form C); Operate Time: 3ms; Switching Voltage: 250VAC, 220VDC - Max; Turn Off Voltage (Min): 0.45 VDC; Turn On Voltage (Max): 3.38 VDC; Category: Relays; Contact Material: Silver Nickel (AgNi), Gold (Au); Contact Rating (Current): 5A; Features: Sealed - Hermetically; Manufacturer Part Number: 9-1462038-8; Mounting Type: Surface Mount; Operating Temperature: -40°C ~ 85°C; Packaging: Tape & Reel (TR); Part Status: Active; Relay Type: Telecom; Release Time: 3ms; RoHS: RoHS Compliant; Supplier: Digi-Key; Termination Style: Gull Wing; ComponentLink1URL: http://www.te.com/commerce/DocumentDelivery/DDEController?Action=srchrtrv&DocNm=108-98001&DocType=SS&DocLang=EN; ComponentLink1Description: http://www.te.com/commerce/DocumentDelivery/DDEController?Action=srchrtrv&DocNm=108-98001&DocType=SS&DocLang=EN; Pricing: 1000=2.338, 3000=2.29625 (USD); Supplier Part Number: PB1171TR-ND
footprint TE_IMxx_GR_JR
pins: 1 T1, 2 NC_1, 3 COM_1, 4 NO_1, 5 NO_2, 6 COM_2, 7 NC_2, 8 T2

## Inductor__7447714680
designator L?, comment 7447714680
FIXED IND 68UH 1.9A 132 MOHM SMD; Manufacturer: Wurth Electronics Inc.; Type: Wirewound; Material - Core: Ferrite; Inductance: 68µH; Tolerance: ±20%; Current - Saturation: 2.2A; Shielding: Shielded; DC Resistance (DCR): 132 mOhm Max; Frequency - Self Resonant: 8MHz; Manufacturer Part Number: 7447714680; Category: Inductors, Coils, Chokes; Supplier: Digi-Key; RoHS: RoHS Compliant; Packaging: Tape & Reel (TR); Part Status: Active; Current Rating: 1.9A; Q @ Freq: -; Ratings: -; Operating Temperature: -40°C ~ 125°C; Mounting Type: Surface Mount; Package / Case: Nonstandard; Supplier Device Package: -; Size / Dimension: 0.394" L x 0.394" W (10.00mm x 10.00mm); Height - Seated (Max): 0.197" (5.00mm); ComponentLink1URL: http://katalog.we-online.de/pbs/datasheet/7447714680.pdf; ComponentLink1Description: http://katalog.we-online.de/pbs/datasheet/7447714680.pdf; Pricing: 500=1.8975 (USD); Stock: 2500; Supplier Part Number: 732-2995-2-ND
footprint INDUCTOR_1050 (10mmx10mm)
pins: 1, 2

## Inductor__74404064101
designator L?, comment 74404064101
FIXED IND 100UH 800MA 433 MOHM; Manufacturer: Wurth Electronics Inc.; Frequency - Self Resonant: 6.3MHz; Current - Saturation: 1A; Shielding: Shielded; Type: Wirewound; Material - Core: Ferrite; Inductance: 100µH; Tolerance: ±20%; Size / Dimension: 0.236" L x 0.236" W (6.00mm x 6.00mm); Height - Seated (Max): 0.177" (4.50mm); Mounting Type: Surface Mount; Package / Case: Nonstandard; Supplier Device Package: 6045; Supplier: Digi-Key; RoHS: RoHS Compliant; Category: Inductors, Coils, Chokes; Manufacturer Part Number: 74404064101; Ratings: -; Operating Temperature: -40°C ~ 125°C; DC Resistance (DCR): 433 mOhm; Q @ Freq: -; Current Rating: 800mA; Packaging: Tape & Reel (TR); Part Status: Active; ComponentLink1URL: http://katalog.we-online.de/pbs/datasheet/74404064101.pdf; ComponentLink1Description: http://katalog.we-online.de/pbs/datasheet/74404064101.pdf; Pricing: 1500=0.694 (USD); Supplier Part Number: 732-5550-2-ND
footprint Inductor_Coilcraft_MSS6132 (6X6MM)
pins: 1, 2

## Inductor__74404064470
designator L?, comment 74404064470
FIXED IND 47UH 1.2A 200 MOHM SMD; Manufacturer: Wurth Electronics Inc.; Current - Saturation: 1.5A; Frequency - Self Resonant: 6.4MHz; Shielding: Shielded; Tolerance: ±20%; Type: Wirewound; Material - Core: Ferrite; Package / Case: Nonstandard; Q @ Freq: -; Operating Temperature: -40°C ~ 125°C; Mounting Type: Surface Mount; Ratings: -; Supplier Device Package: 6045; Height - Seated (Max): 0.177" (4.50mm); Size / Dimension: 0.236" L x 0.236" W (6.00mm x 6.00mm); DC Resistance (DCR): 200 mOhm; Packaging: Tape & Reel (TR); RoHS: RoHS Compliant; Supplier: Digi-Key; Manufacturer Part Number: 74404064470; Category: Inductors, Coils, Chokes; Part Status: Active; ComponentLink1URL: http://katalog.we-online.de/pbs/datasheet/74404064470.pdf; ComponentLink1Description: http://katalog.we-online.de/pbs/datasheet/74404064470.pdf; Pricing: 1500=0.694 (USD); Supplier Part Number: 732-5556-2-ND
footprint Inductor_74404064470 (6x6mm)
pins: 1, 2

## Inductor__CDRH6D38-6R2NC
designator L?, comment CDRH6D38NP-6R2NC